# Altium footprint library PcbLib.PcbLib: 428 footprints (part 3 of 27)
Each footprint in its own frame and in the unit in brackets; x right, y up, seen from the top. Pads: shape width x height; smd on the part's side, far side on the other; paste and mask are expansions set on the pad; w line width, h text height; cw(c..) or ccw(c..) is an arc to the next point about the centre after c.
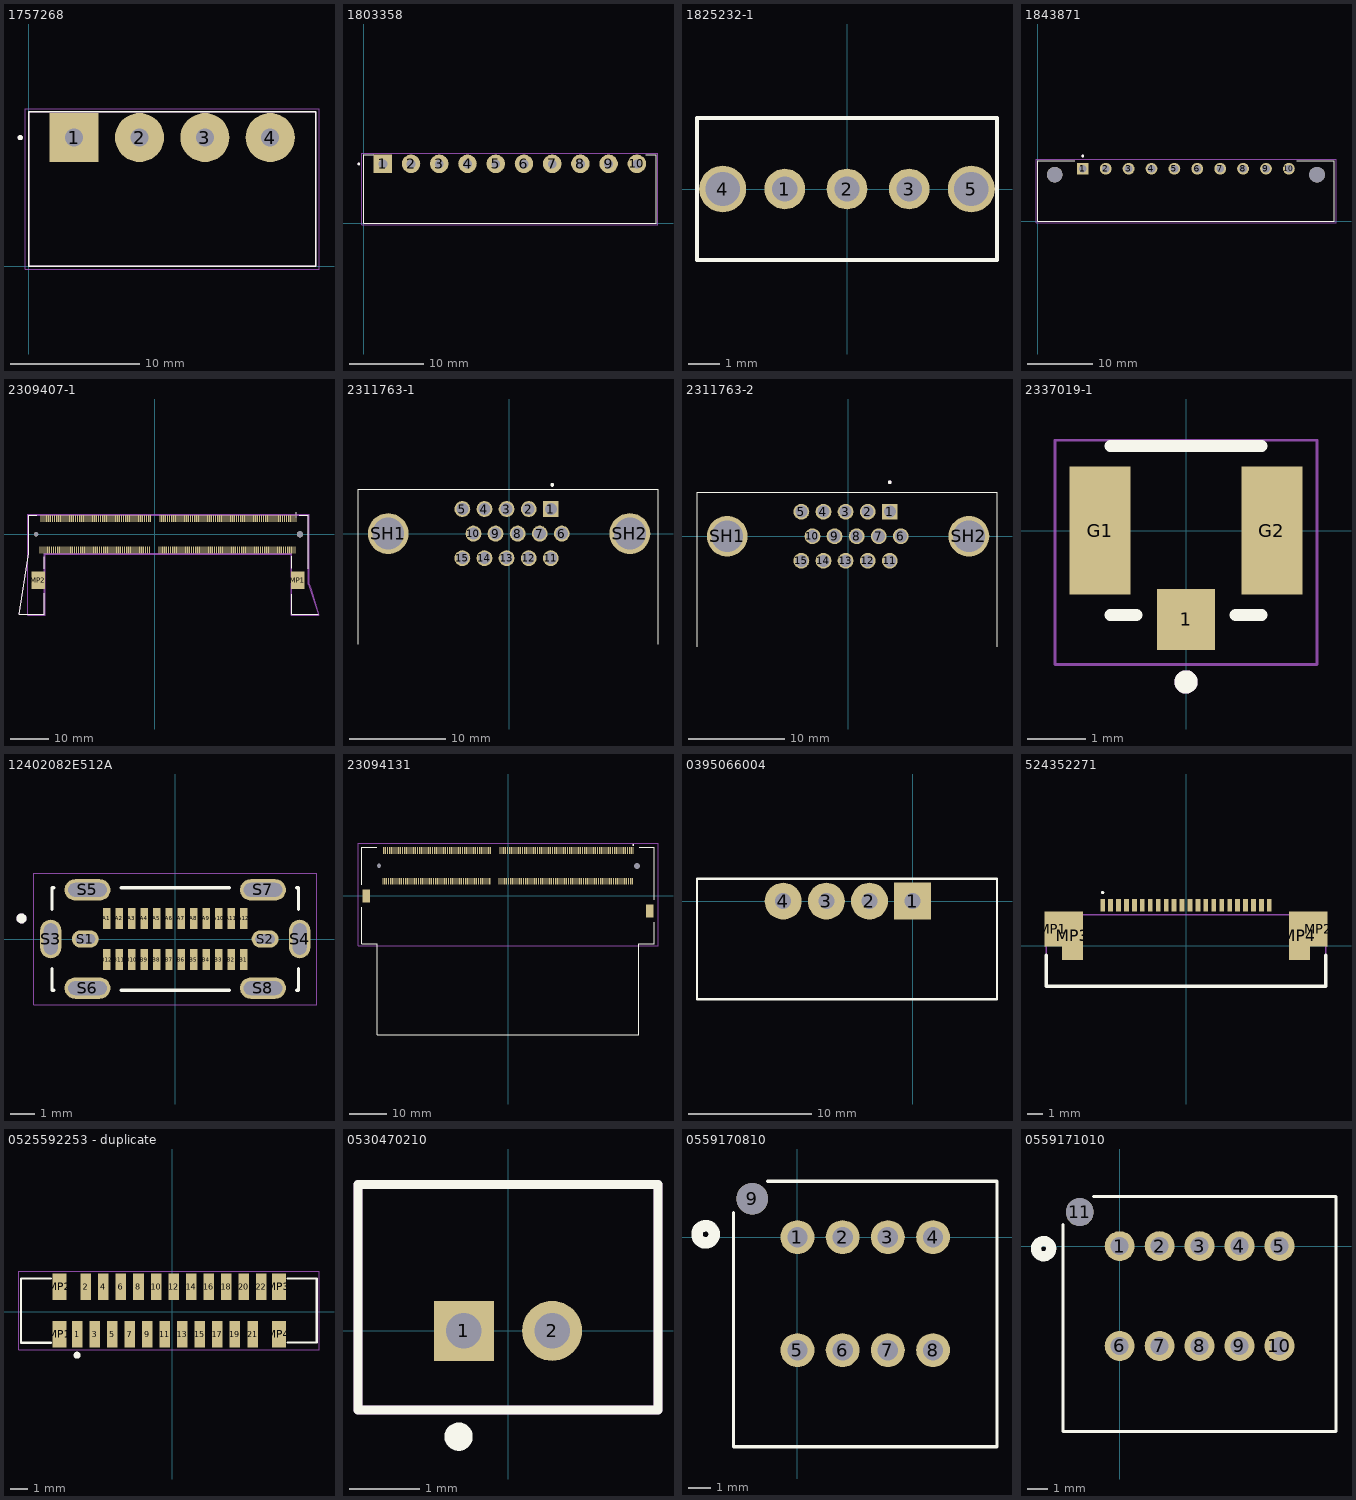
[diagram p2: the footprints below, top view; thin cyan lines are the x and y axes]

## 1757268 [mm]
pads (4):
  rect 3.81x3.81 / inner round 3.81 / far side rect 3.81x3.81 hole 1.4: 1(3.54,10)
  round 3.81 hole 1.4: 2(8.62,10) 3(13.7,10) 4(18.78,10)
Top Overlay:
  circle w0.2: c-0.65,10 r0.1
  lines w0.127: 0,0 22.32,0 22.32,12 0,12 0,0
Mechanical 13:
  circle w0.2: c-0.65,10 r0.1
  lines w0.127: 0,0 22.32,0 22.32,12 0,12 0,0
Mechanical 15:
  lines w0.05: -0.25,-0.25 22.57,-0.25 22.57,12.25 -0.25,12.25 -0.25,-0.25
3D body "1757268.stp": height 8.57, standoff -3.5, extent 0,0 22.32,12

## 1803358 [mm]
pads (10):
  rect 2.5x2.5 hole 1.2: 1(2.6,8)
  round 2.5 hole 1.2: 2(6.41,8) 3(10.22,8) 4(14.03,8) 5(17.84,8) 6(21.65,8) 7(25.46,8) 8(29.27,8) 9(33.08,8) 10(36.89,8)
Top Overlay:
  circle w0.2: c-0.65,8 r0.1
  lines w0.127: 1.38,9.2 0,9.2 0,0 39.49,0 39.49,9.2 38.11,9.2
Mechanical 13:
  circle w0.2: c-0.65,8 r0.1
Mechanical 15:
  lines w0.05: -0.25,-0.25 -0.25,9.45 39.74,9.45 39.74,-0.25 -0.25,-0.25
3D body "1803358.step": height 7.25, standoff -3.4, extent 0.007,-0.056 39.497,9.144

## 1825232-1 [mm]
pads (5):
  round 1.308 hole 0.81: 1(-2,0) 2(0,0) 3(2,0)
  round 1.508 hole 1.1: 4(-4,0) 5(4,0)
Top Overlay:
  lines w0.127: -4.826,-2.286 4.826,-2.286 4.826,2.286 -4.826,2.286 -4.826,-2.286
3D body "step_temp.STEP": height 3.5, standoff -2.77, extent -4.587,-5.15 4.587,2.15

## 1843871 [mm]
pads (12):
  rect 1.8x1.8 / inner round 1.8 / far side rect 1.8x1.8 hole 1.2: 1(6.9,8)
  round 1.8 hole 1.2: 2(10.4,8) 3(13.9,8) 4(17.4,8) 5(20.9,8) 6(24.4,8) 7(27.9,8) 8(31.4,8) 9(34.9,8) 10(38.4,8)
  round 2.4 hole 2.4 unplated: ""(2.6,7.1) ""(42.7,7.1)
Top Overlay:
  circle w0.2: c6.9,9.95 r0.1
  lines w0.127: 5.68,9.2 0,9.2 0,0 45.35,0 45.35,9.2 39.62,9.2
Mechanical 13:
  circle w0.2: c6.9,9.95 r0.1
Mechanical 15:
  lines w0.05: -0.25,-0.25 45.6,-0.25 45.6,9.45 -0.25,9.45 -0.25,-0.25
3D body "1843871.stp": height 7.45, standoff -3.2, extent -0.044,0 45.256,9.2

## 2309407-1 [mm]
pads (264):
  rect 0.3x1.75 smd: 1(36.875,4.1) 2(36.625,-4.1) 3(36.375,4.1) 4(36.125,-4.1) 5(35.875,4.1) 6(35.625,-4.1) 7(35.375,4.1) 8(35.125,-4.1) 9(34.875,4.1) 10(34.625,-4.1) 11(34.375,4.1) 12(34.125,-4.1) 13(33.875,4.1) 14(33.625,-4.1) 15(33.375,4.1) 16(33.125,-4.1) 17(32.875,4.1) 18(32.625,-4.1) 19(32.375,4.1) 20(32.125,-4.1) 21(31.875,4.1) 22(31.625,-4.1) 23(31.375,4.1) 24(31.125,-4.1) 25(30.875,4.1) 26(30.625,-4.1) 27(30.375,4.1) 28(30.125,-4.1) 29(29.875,4.1) 30(29.625,-4.1) 31(29.375,4.1) 32(29.125,-4.1) 33(28.875,4.1) 34(28.625,-4.1) 35(28.375,4.1) 36(28.125,-4.1) 37(27.875,4.1) 38(27.625,-4.1) 39(27.375,4.1) 40(27.125,-4.1) 41(26.875,4.1) 42(26.625,-4.1) 43(26.375,4.1) 44(26.125,-4.1) 45(25.875,4.1) 46(25.625,-4.1) 47(25.375,4.1) 48(25.125,-4.1) 49(24.875,4.1) 50(24.625,-4.1) 51(24.375,4.1) 52(24.125,-4.1) 53(23.875,4.1) 54(23.625,-4.1) 55(23.375,4.1) 56(23.125,-4.1) 57(22.875,4.1) 58(22.625,-4.1) 59(22.375,4.1) 60(22.125,-4.1) 61(21.875,4.1) 62(21.625,-4.1) 63(21.375,4.1) 64(21.125,-4.1) 65(20.875,4.1) 66(20.625,-4.1) 67(20.375,4.1) 68(20.125,-4.1) 69(19.875,4.1) 70(19.625,-4.1) 71(19.375,4.1) 72(19.125,-4.1) 73(18.875,4.1) 74(18.625,-4.1) 75(18.375,4.1) 76(18.125,-4.1) 77(17.875,4.1) 78(17.625,-4.1) 79(17.375,4.1) 80(17.125,-4.1) 81(16.875,4.1) 82(16.625,-4.1) 83(16.375,4.1) 84(16.125,-4.1) 85(15.875,4.1) 86(15.625,-4.1) 87(15.375,4.1) 88(15.125,-4.1) 89(14.875,4.1) 90(14.625,-4.1) 91(14.375,4.1) 92(14.125,-4.1) 93(13.875,4.1) 94(13.625,-4.1) 95(13.375,4.1) 96(13.125,-4.1) 97(12.875,4.1) 98(12.625,-4.1) 99(12.375,4.1) 100(12.125,-4.1) 101(11.875,4.1) 102(11.625,-4.1) 103(11.375,4.1) 104(11.125,-4.1) 105(10.875,4.1) 106(10.625,-4.1) 107(10.375,4.1) 108(10.125,-4.1) 109(9.875,4.1) 110(9.625,-4.1) 111(9.375,4.1) 112(9.125,-4.1) 113(8.875,4.1) 114(8.625,-4.1) 115(8.375,4.1) 116(8.125,-4.1) 117(7.875,4.1) 118(7.625,-4.1) 119(7.375,4.1) 120(7.125,-4.1) 121(6.875,4.1) 122(6.625,-4.1) 123(6.375,4.1) 124(6.125,-4.1) 125(5.875,4.1) 126(5.625,-4.1) 127(5.375,4.1) 128(5.125,-4.1) 129(4.875,4.1) 130(4.625,-4.1) 131(4.375,4.1) 132(4.125,-4.1) 133(3.875,4.1) 134(3.625,-4.1) 135(3.375,4.1) 136(3.125,-4.1) 137(2.875,4.1) 138(2.625,-4.1) 139(2.375,4.1) 140(2.125,-4.1) 141(1.875,4.1) 142(1.625,-4.1) 143(1.375,4.1) 144(1.125,-4.1) 145(-1.125,4.1) 146(-1.375,-4.1) 147(-1.625,4.1) 148(-1.875,-4.1) 149(-2.125,4.1) 150(-2.375,-4.1) 151(-2.625,4.1) 152(-2.875,-4.1) 153(-3.125,4.1) 154(-3.375,-4.1) 155(-3.625,4.1) 156(-3.875,-4.1) 157(-4.125,4.1) 158(-4.375,-4.1) 159(-4.625,4.1) 160(-4.875,-4.1) 161(-5.125,4.1) 162(-5.375,-4.1) 163(-5.625,4.1) 164(-5.875,-4.1) 165(-6.125,4.1) 166(-6.375,-4.1) 167(-6.625,4.1) 168(-6.875,-4.1) 169(-7.125,4.1) 170(-7.375,-4.1) 171(-7.625,4.1) 172(-7.875,-4.1) 173(-8.125,4.1) 174(-8.375,-4.1) 175(-8.625,4.1) 176(-8.875,-4.1) 177(-9.125,4.1) 178(-9.375,-4.1) 179(-9.625,4.1) 180(-9.875,-4.1) 181(-10.125,4.1) 182(-10.375,-4.1) 183(-10.625,4.1) 184(-10.875,-4.1) 185(-11.125,4.1) 186(-11.375,-4.1) 187(-11.625,4.1) 188(-11.875,-4.1) 189(-12.125,4.1) 190(-12.375,-4.1) 191(-12.625,4.1) 192(-12.875,-4.1) 193(-13.125,4.1) 194(-13.375,-4.1) 195(-13.625,4.1) 196(-13.875,-4.1) 197(-14.125,4.1) 198(-14.375,-4.1) 199(-14.625,4.1) 200(-14.875,-4.1) 201(-15.125,4.1) 202(-15.375,-4.1) 203(-15.625,4.1) 204(-15.875,-4.1) 205(-16.125,4.1) 206(-16.375,-4.1) 207(-16.625,4.1) 208(-16.875,-4.1) 209(-17.125,4.1) 210(-17.375,-4.1) 211(-17.625,4.1) 212(-17.875,-4.1) 213(-18.125,4.1) 214(-18.375,-4.1) 215(-18.625,4.1) 216(-18.875,-4.1) 217(-19.125,4.1) 218(-19.375,-4.1) 219(-19.625,4.1) 220(-19.875,-4.1) 221(-20.125,4.1) 222(-20.375,-4.1) 223(-20.625,4.1) 224(-20.875,-4.1) 225(-21.125,4.1) 226(-21.375,-4.1) 227(-21.625,4.1) 228(-21.875,-4.1) 229(-22.125,4.1) 230(-22.375,-4.1) 231(-22.625,4.1) 232(-22.875,-4.1) 233(-23.125,4.1) 234(-23.375,-4.1) 235(-23.625,4.1) 236(-23.875,-4.1) 237(-24.125,4.1) 238(-24.375,-4.1) 239(-24.625,4.1) 240(-24.875,-4.1) 241(-25.125,4.1) 242(-25.375,-4.1) 243(-25.625,4.1) 244(-25.875,-4.1) 245(-26.125,4.1) 246(-26.375,-4.1) 247(-26.625,4.1) 248(-26.875,-4.1) 249(-27.125,4.1) 250(-27.375,-4.1) 251(-27.625,4.1) 252(-27.875,-4.1) 253(-28.125,4.1) 254(-28.375,-4.1) 255(-28.625,4.1) 256(-28.875,-4.1) 257(-29.125,4.1) 258(-29.375,-4.1) 259(-29.625,4.1) 260(-29.875,-4.1)
  rect 3.5x4.6 smd: MP1(37.3,-12) MP2(-30.3,-12)
  round 1.1 hole 1.1 unplated: ""(-30.9,0)
  round 1.6 hole 1.6 unplated: ""(37.9,0)
Top Overlay:
  circle w0.2: c36.875,5.5 r0.1
  lines w0.127: -30.725,5 -32.875,5 -32.875,-5 -35.375,-20.85 -28.825,-20.85 -28.825,-15.402 ; -28.825,-9 -28.825,-5.85 ; 35.825,-15.6 35.825,-20.85 42.625,-20.85 ; 35.825,-8.85 35.825,-5.7 ; 37.725,5 40.125,5 40.125,-9.031
Mechanical 13:
  circle w0.1: c36.875,4.5 r0.05
  lines w0.127: -35.375,-20.85 -28.825,-20.85 -28.825,-5 35.825,-5 35.825,-20.85 42.625,-20.85 40.125,-13.031 40.125,5 -32.875,5 ccw(c-32.802,4.928) -32.875,4.855 -32.875,-5.08 -35.375,-20.85
Mechanical 15:
  lines w0.05: -33.125,-21.1 -33.125,5.25 40.375,5.25 40.375,-13.081 40.875,-14.531 42.875,-21.1 35.575,-21.1 35.575,-5.25 -28.575,-5.25 -28.575,-21.1 -33.125,-21.1
3D body "2309407-1--3DModel-STEP-1.STEP": height 4.25, standoff -0.45, extent -32.944,-20.926 40.056,4.924
3D body "02.STEP": height 2.77, standoff 1.57, extent -31.242,-44.852 38.358,0.148

## 2311763-1 [mil]
height 505.91
pads (17):
  rect 64.5x64.5 / inner round 64.5 / far side rect 64.5x64.5 hole 49.21: 1(170,100)
  round 64.5 hole 49.21: 2(80,100) 3(-10,100) 4(-100,100) 5(-190,100) 6(215,0) 7(125,0) 8(35,0) 9(-55,0) 10(-145,0) 11(170,-100) 12(80,-100) 13(-10,-100) 14(-100,-100) 15(-190,-100)
  round 166 hole 129.92: SH1(-492,0) SH2(492,0)
Top Overlay:
  circle w7.87: c175.83,198.46 r3.94
  lines w5: -615,-450 -615,180 606.5,180 606.5,-450
3D body "2311763-1.stp": height 503.94, standoff -139.76, extent -613.19,-683.23 599.41,175.04

## 2311763-2 [mil]
height 505.91
pads (17):
  rect 64.5x64.5 / inner round 64.5 / far side rect 64.5x64.5 hole 49.21: 1(170,100)
  round 64.5 hole 49.21: 2(80,100) 3(-10,100) 4(-100,100) 5(-190,100) 6(215,0) 7(125,0) 8(35,0) 9(-55,0) 10(-145,0) 11(170,-100) 12(80,-100) 13(-10,-100) 14(-100,-100) 15(-190,-100)
  round 166 hole 129.92: SH1(-492,0) SH2(492,0)
Top Overlay:
  circle w7.87: c170,220.02 r3.94
  lines w5: -615,-450 -615,180 606.5,180 606.5,-450
Mechanical 13:
  circle w7.87: c170,220.02 r3.94
3D body "2311763-2.stp": height 523.62, standoff -131.89, extent -611.3,-684.27 601.3,174

## 2337019-1 [mm]
pads (3):
  rect 1x1.05 smd: 1(0,-1.525)
  rect 1.05x2.2 smd: G1(-1.475,0) G2(1.475,0)
Top Overlay:
  circle w0.2: c0,-2.6 r0.1
  lines w0.2: -1.3,-1.45 -0.85,-1.45 ; -1.3,1.45 1.3,1.45 ; 0.85,-1.45 1.3,-1.45
Mechanical 13:
  circle w0.2: c0,-2.6 r0.1
Mechanical 15:
  lines w0.05: -2.25,-2.3 2.25,-2.3 2.25,1.55 -2.25,1.55 -2.25,-2.3
3D body "c-2337019-1-a2-3d.stp": height 1.3, standoff 0.05, extent -1.47,-1.56 1.53,1.54

## 12402082E512A [mm]
height 7.5
pads (32):
  rect 0.3x0.85 smd: A1(-2.75,0.825) A2(-2.25,0.825) A3(-1.75,0.825) A4(-1.25,0.825) A5(-0.75,0.825) A6(-0.25,0.825) A7(0.25,0.825) A8(0.75,0.825) A9(1.25,0.825) A10(1.75,0.825) A11(2.25,0.825) A12(2.75,0.825) B1(2.75,-0.825) B2(2.25,-0.825) B3(1.75,-0.825) B4(1.25,-0.825) B5(0.75,-0.825) B6(0.25,-0.825) B7(-0.25,-0.825) B8(-0.75,-0.825) B9(-1.25,-0.825) B10(-1.75,-0.825) B11(-2.25,-0.825) B12(-2.75,-0.825)
  oval 1.08x0.7 hole 0.4 slot 0.78 at 0 deg: S1(-3.61,0) S2(3.61,0)
  oval 0.85x1.55 hole 0.55 slot 1.25 at 90 deg: S3(-5,0) S4(5,0)
  oval 1.85x0.85 hole 0.55 slot 1.55 at 0 deg: S5(-3.525,1.975) S6(-3.525,-1.975) S7(3.525,1.975) S8(3.525,-1.975)
Top Overlay:
  circle w0.2: c-6.175,0.825 r0.1
  lines w0.127: -4.945,-1.195 -4.945,-2.06 -4.87,-2.06 ; -4.945,1.195 -4.945,2.06 -4.87,2.06 ; -2.18,-2.06 2.18,-2.06 ; -2.18,2.06 2.18,2.06 ; 4.87,-2.06 4.945,-2.06 4.945,-1.195 ; 4.87,2.06 4.945,2.06 4.945,1.195
Mechanical 13:
  circle w0.2: c-6.175,0.825 r0.1
Mechanical 15:
  lines w0.05: -5.675,-2.65 -5.675,2.65 5.675,2.65 5.675,-2.65 -5.675,-2.65
3D body "step_temp.STEP": height 7.5, standoff -1, extent -5.125,-2.1 5.125,2.1

## 23094131 [mm]
pads (264):
  rect 0.3x1.75 smd: 1(33.375,12.025) 2(33.125,3.825) 3(32.875,12.025) 4(32.625,3.825) 5(32.375,12.025) 6(32.125,3.825) 7(31.875,12.025) 8(31.625,3.825) 9(31.375,12.025) 10(31.125,3.825) 11(30.875,12.025) 12(30.625,3.825) 13(30.375,12.025) 14(30.125,3.825) 15(29.875,12.025) 16(29.625,3.825) 17(29.375,12.025) 18(29.125,3.825) 19(28.875,12.025) 20(28.625,3.825) 21(28.375,12.025) 22(28.125,3.825) 23(27.875,12.025) 24(27.625,3.825) 25(27.375,12.025) 26(27.125,3.825) 27(26.875,12.025) 28(26.625,3.825) 29(26.375,12.025) 30(26.125,3.825) 31(25.875,12.025) 32(25.625,3.825) 33(25.375,12.025) 34(25.125,3.825) 35(24.875,12.025) 36(24.625,3.825) 37(24.375,12.025) 38(24.125,3.825) 39(23.875,12.025) 40(23.625,3.825) 41(23.375,12.025) 42(23.125,3.825) 43(22.875,12.025) 44(22.625,3.825) 45(22.375,12.025) 46(22.125,3.825) 47(21.875,12.025) 48(21.625,3.825) 49(21.375,12.025) 50(21.125,3.825) 51(20.875,12.025) 52(20.625,3.825) 53(20.375,12.025) 54(20.125,3.825) 55(19.875,12.025) 56(19.625,3.825) 57(19.375,12.025) 58(19.125,3.825) 59(18.875,12.025) 60(18.625,3.825) 61(18.375,12.025) 62(18.125,3.825) 63(17.875,12.025) 64(17.625,3.825) 65(17.375,12.025) 66(17.125,3.825) 67(16.875,12.025) 68(16.625,3.825) 69(16.375,12.025) 70(16.125,3.825) 71(15.875,12.025) 72(15.625,3.825) 73(15.375,12.025) 74(15.125,3.825) 75(14.875,12.025) 76(14.625,3.825) 77(14.375,12.025) 78(14.125,3.825) 79(13.875,12.025) 80(13.625,3.825) 81(13.375,12.025) 82(13.125,3.825) 83(12.875,12.025) 84(12.625,3.825) 85(12.375,12.025) 86(12.125,3.825) 87(11.875,12.025) 88(11.625,3.825) 89(11.375,12.025) 90(11.125,3.825) 91(10.875,12.025) 92(10.625,3.825) 93(10.375,12.025) 94(10.125,3.825) 95(9.875,12.025) 96(9.625,3.825) 97(9.375,12.025) 98(9.125,3.825) 99(8.875,12.025) 100(8.625,3.825) 101(8.375,12.025) 102(8.125,3.825) 103(7.875,12.025) 104(7.625,3.825) 105(7.375,12.025) 106(7.125,3.825) 107(6.875,12.025) 108(6.625,3.825) 109(6.375,12.025) 110(6.125,3.825) 111(5.875,12.025) 112(5.625,3.825) 113(5.375,12.025) 114(5.125,3.825) 115(4.875,12.025) 116(4.625,3.825) 117(4.375,12.025) 118(4.125,3.825) 119(3.875,12.025) 120(3.625,3.825) 121(3.375,12.025) 122(3.125,3.825) 123(2.875,12.025) 124(2.625,3.825) 125(2.375,12.025) 126(2.125,3.825) 127(1.875,12.025) 128(1.625,3.825) 129(1.375,12.025) 130(1.125,3.825) 131(0.875,12.025) 132(0.625,3.825) 133(0.375,12.025) 134(0.125,3.825) 135(-0.125,12.025) 136(-0.375,3.825) 137(-0.625,12.025) 138(-0.875,3.825) 139(-1.125,12.025) 140(-1.375,3.825) 141(-1.625,12.025) 142(-1.875,3.825) 143(-2.125,12.025) 144(-2.375,3.825) 145(-4.625,12.025) 146(-4.875,3.825) 147(-5.125,12.025) 148(-5.375,3.825) 149(-5.625,12.025) 150(-5.875,3.825) 151(-6.125,12.025) 152(-6.375,3.825) 153(-6.625,12.025) 154(-6.875,3.825) 155(-7.125,12.025) 156(-7.375,3.825) 157(-7.625,12.025) 158(-7.875,3.825) 159(-8.125,12.025) 160(-8.375,3.825) 161(-8.625,12.025) 162(-8.875,3.825) 163(-9.125,12.025) 164(-9.375,3.825) 165(-9.625,12.025) 166(-9.875,3.825) 167(-10.125,12.025) 168(-10.375,3.825) 169(-10.625,12.025) 170(-10.875,3.825) 171(-11.125,12.025) 172(-11.375,3.825) 173(-11.625,12.025) 174(-11.875,3.825) 175(-12.125,12.025) 176(-12.375,3.825) 177(-12.625,12.025) 178(-12.875,3.825) 179(-13.125,12.025) 180(-13.375,3.825) 181(-13.625,12.025) 182(-13.875,3.825) 183(-14.125,12.025) 184(-14.375,3.825) 185(-14.625,12.025) 186(-14.875,3.825) 187(-15.125,12.025) 188(-15.375,3.825) 189(-15.625,12.025) 190(-15.875,3.825) 191(-16.125,12.025) 192(-16.375,3.825) 193(-16.625,12.025) 194(-16.875,3.825) 195(-17.125,12.025) 196(-17.375,3.825) 197(-17.625,12.025) 198(-17.875,3.825) 199(-18.125,12.025) 200(-18.375,3.825) 201(-18.625,12.025) 202(-18.875,3.825) 203(-19.125,12.025) 204(-19.375,3.825) 205(-19.625,12.025) 206(-19.875,3.825) 207(-20.125,12.025) 208(-20.375,3.825) 209(-20.625,12.025) 210(-20.875,3.825) 211(-21.125,12.025) 212(-21.375,3.825) 213(-21.625,12.025) 214(-21.875,3.825) 215(-22.125,12.025) 216(-22.375,3.825) 217(-22.625,12.025) 218(-22.875,3.825) 219(-23.125,12.025) 220(-23.375,3.825) 221(-23.625,12.025) 222(-23.875,3.825) 223(-24.125,12.025) 224(-24.375,3.825) 225(-24.625,12.025) 226(-24.875,3.825) 227(-25.125,12.025) 228(-25.375,3.825) 229(-25.625,12.025) 230(-25.875,3.825) 231(-26.125,12.025) 232(-26.375,3.825) 233(-26.625,12.025) 234(-26.875,3.825) 235(-27.125,12.025) 236(-27.375,3.825) 237(-27.625,12.025) 238(-27.875,3.825) 239(-28.125,12.025) 240(-28.375,3.825) 241(-28.625,12.025) 242(-28.875,3.825) 243(-29.125,12.025) 244(-29.375,3.825) 245(-29.625,12.025) 246(-29.875,3.825) 247(-30.125,12.025) 248(-30.375,3.825) 249(-30.625,12.025) 250(-30.875,3.825) 251(-31.125,12.025) 252(-31.375,3.825) 253(-31.625,12.025) 254(-31.875,3.825) 255(-32.125,12.025) 256(-32.375,3.825) 257(-32.625,12.025) 258(-32.875,3.825) 259(-33.125,12.025) 260(-33.375,3.825)
  rect 2x3.5 smd: MP1(37.75,-4.075) MP2(-37.75,-0.075)
  round 0.575 hole 1.15 unplated: ""(-34.4,7.925)
  round 0.825 hole 1.65 unplated: ""(34.4,7.925)
Top Overlay:
  lines w0.1: -39,-3.075 -39,-12.85 -34.85,-12.85 -34.85,-37.09 34.84,-37.09 34.84,-12.86 39,-12.86 39,-7.075 ; -39,2.925 -39,12.925 -35,12.925 ; 35,12.925 39,12.925 39,-1.075
  lines w0.2: 33.4,13.4 ccw(c33.4,13.5) 33.4,13.6 ccw(c33.4,13.5) 33.4,13.4
Mechanical 15:
  lines w0.1: -40,-13.35 40,-13.35 40,13.925 -40,13.925 -40,-13.35
3D body "675_13541_batuu_dev_kit_top_ass_asm.STEP": height 26.77, standoff 4.06, extent -34.807,-36.998 34.793,8.002
3D body "2309413-1.stp": height 9.28, standoff -0.37, extent -38.045,-12.78 38.054,13.07

## 0395066004 [mm]
pads (4):
  rect 3x3 hole 1.3: 1(0,0)
  round 3 hole 1.3: 2(-3.5,0) 3(-7,0) 4(-10.5,0)
Top Overlay:
  lines w0.2: -17.5,1.8 -17.5,-7.95 6.856,-7.95 6.856,1.8 -17.45,1.8
3D body "395066004.stp": height 6.86, standoff -3.56, extent -17.454,-7.9 6.854,1.244

## 524352271 [mm]
pads (26):
  rect 0.3x0.8 smd: 1(-5.25,2.55) 2(-4.75,2.55) 3(-4.25,2.55) 4(-3.75,2.55) 5(-3.25,2.55) 6(-2.75,2.55) 7(-2.25,2.55) 8(-1.75,2.55) 9(-1.25,2.55) 10(-0.75,2.55) 11(-0.25,2.55) 12(0.25,2.55) 13(0.75,2.55) 14(1.25,2.55) 15(1.75,2.55) 16(2.25,2.55) 17(2.75,2.55) 18(3.25,2.55) 19(3.75,2.55) 20(4.25,2.55) 21(4.75,2.55) 22(5.25,2.55)
  rect 1.1x2.2 smd: MP1(-8.35,1.05) MP2(8.35,1.05)
  rect 1.3x3.05 smd: MP3(-7.15,0.625) MP4(7.15,0.625)
Top Overlay:
  lines w0.1: -5.25,3.3 ccw(c-5.25,3.35) -5.25,3.4 ccw(c-5.25,3.35) -5.25,3.3
  lines w0.2: -8.8,-0.59 -8.8,-2.55 8.8,-2.55 8.8,-0.59
Mechanical 15:
  lines w0.1: -8.8,-2.55 -8.8,1.95 8.8,1.95 8.8,-2.55 -8.8,-2.55
3D body "52435-2271.stp": height 2, standoff -0.05, extent -8.8,-2.55 8.8,2.65

## 0525592253 - duplicate [mm]
pads (26):
  rect 0.6x1.5 smd: 1(-5.419,-1.294) 2(-4.919,1.406) 3(-4.419,-1.294) 4(-3.919,1.406) 5(-3.419,-1.294) 6(-2.919,1.406) 7(-2.419,-1.294) 8(-1.919,1.406) 9(-1.419,-1.294) 10(-0.919,1.406) 11(-0.419,-1.294) 12(0.081,1.406) 13(0.581,-1.294) 14(1.081,1.406) 15(1.581,-1.294) 16(2.081,1.406) 17(2.581,-1.294) 18(3.081,1.406) 19(3.581,-1.294) 20(4.081,1.406) 21(4.581,-1.294) 22(5.081,1.406)
  rect 0.8x1.5 smd: MP1(-6.419,-1.294) MP2(-6.419,1.406) MP3(6.081,1.406) MP4(6.081,-1.294)
Top Overlay:
  circle w0.2: c-5.42,-2.49 r0.1
  lines w0.127: -6.919,-1.78 -8.62,-1.78 -8.62,1.88 -6.919,1.88 ; 6.581,-1.76 8.24,-1.76 8.24,1.88 6.581,1.88
Mechanical 15:
  lines w0.05: -8.73,-2.19 8.37,-2.19 8.37,2.31 -8.73,2.31 -8.73,-2.19
3D body "525592253.stp": height 3.9, standoff 0, extent -8.54,-1.7 8.16,1.8

## 0530470210 [mm]
pads (2):
  rect 0.85x0.85 / inner round 0.85 / far side rect 0.85x0.85 hole 0.5: 1(-0.625,0)
  round 0.85 hole 0.5: 2(0.625,0)
Top Overlay:
  circle w0.2: c-0.7,-1.5 r0.1
  lines w0.127: -2.125,-1.125 -2.125,2.075 2.125,2.075 2.125,-1.125 -2.125,-1.125
Mechanical 13:
  lines w0.127: -2.125,-1.125 -2.125,2.075 2.125,2.075 2.125,-1.125 -2.125,-1.125
3D body "530470210.step": height 4.27, standoff -2.23, extent -2.125,-1.092 2.125,2.108

## 0559170810 [mm]
pads (9):
  round 1.5 hole 0.9 paste-2539.97 mask+0: 1(0,0) 2(2,0) 3(4,0) 4(6,0) 5(0,-5) 6(2,-5) 7(4,-5) 8(6,-5)
  round 1.397 / inner round 1.524 / far side round 1.397 hole 1.397 unplated paste-2539.97 mask+0: 9(-2,1.7)
Top Overlay:
  circle w0.508: c-4.064,0.127 r0.381
  lines w0.152: -2.829,1.087 -2.829,-9.277 8.829,-9.277 8.829,2.477 -1.322,2.477
3D body "559170810.stp": height 9.75, standoff -3.2, extent -2.677,-9.138 8.723,2.362

## 0559171010 [mm]
pads (11):
  round 1.5 hole 0.9 paste-2539.97 mask+0: 1(0,0) 2(2,0) 3(4,0) 4(6,0) 5(8,0) 6(0,-5) 7(2,-5) 8(4,-5) 9(6,-5) 10(8,-5)
  round 1.397 hole 1.397 unplated paste-2539.97 mask+0: 11(-2,1.7)
Top Overlay:
  circle w0.508: c-3.81,-0.127 r0.381
  lines w0.152: -2.833,1.092 -2.833,-9.277 10.833,-9.277 10.833,2.477 -1.322,2.477
3D body "559171010.stp": height 9.75, standoff -3.2, extent -2.667,-9.179 10.733,2.321